# Altium footprint library RelaysTHD.PcbLib: 13 footprints
Each footprint in its own frame and in the unit in brackets; x right, y up, seen from the top. Pads: shape width x height; smd on the part's side, far side on the other; paste and mask are expansions set on the pad; w line width, h text height; cw(c..) or ccw(c..) is an arc to the next point about the centre after c.
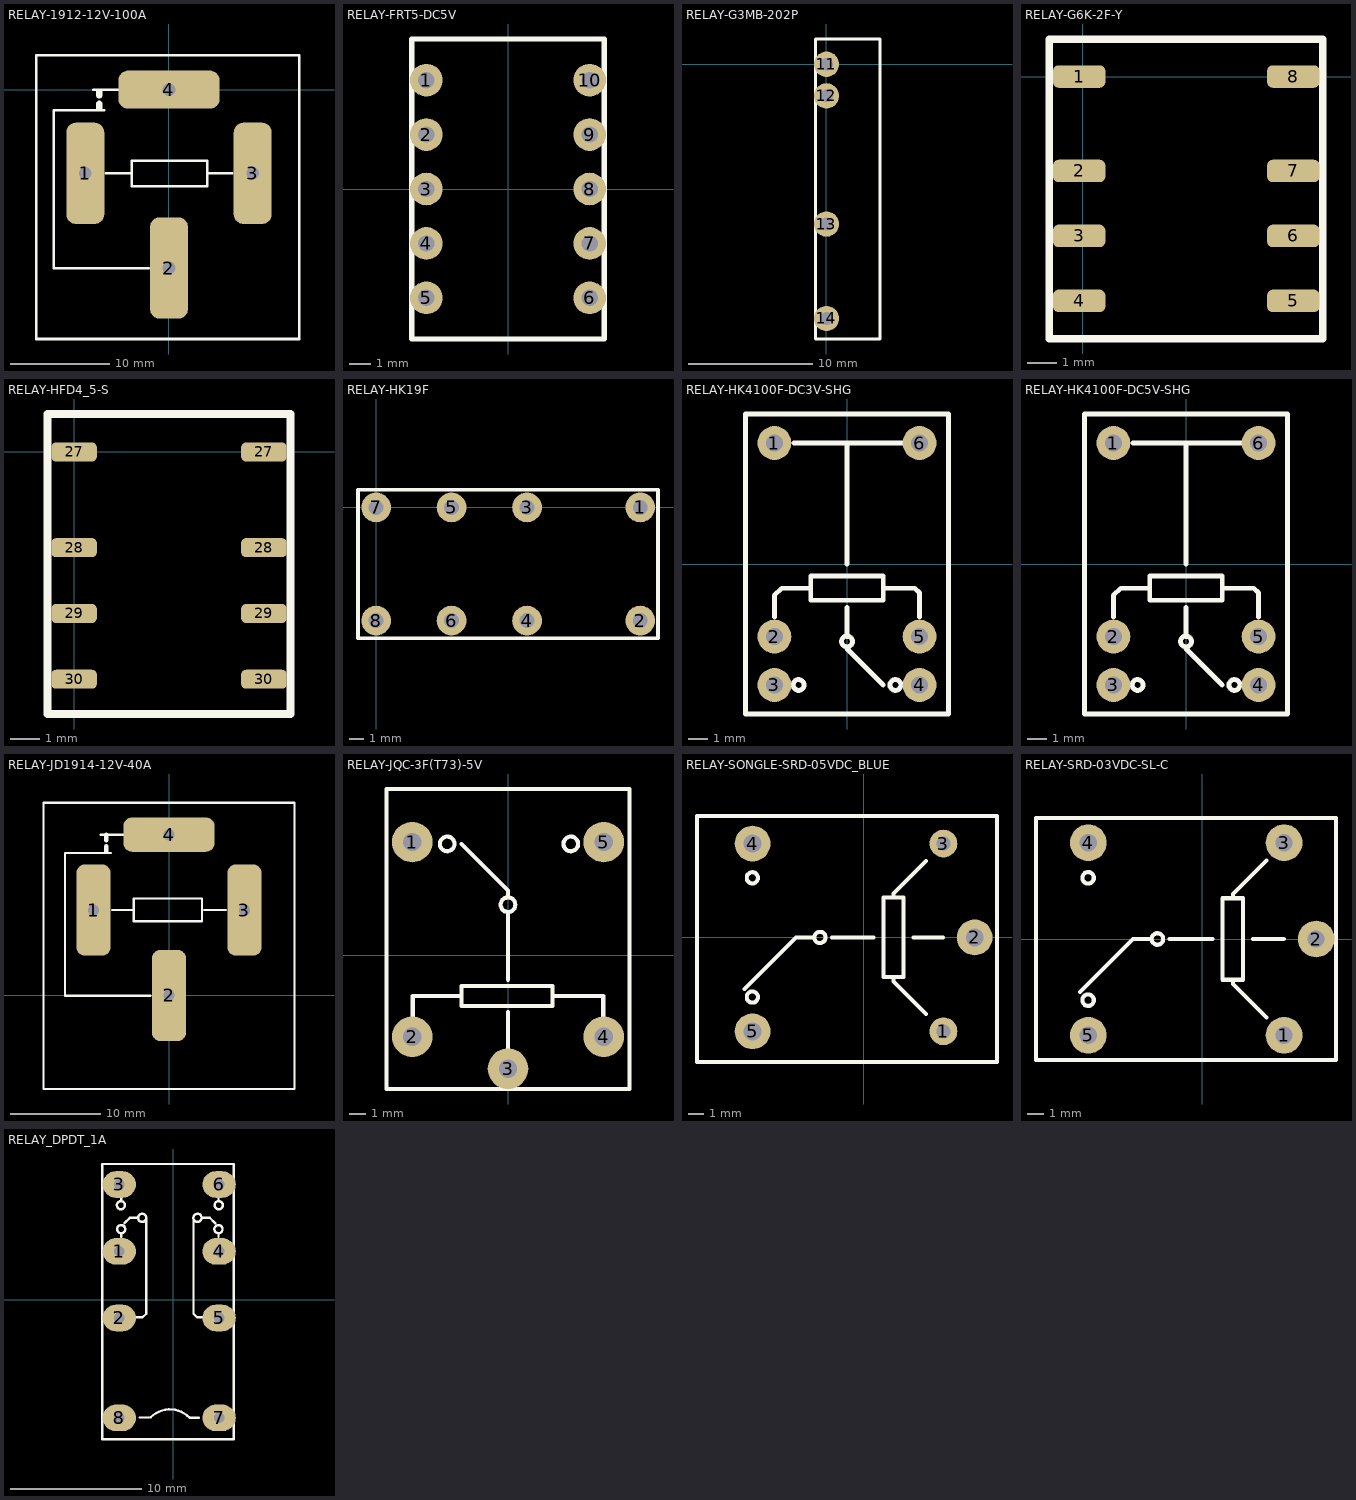
[diagram p0: the footprints below, top view; thin cyan lines are the x and y axes]

## RELAY-1912-12V-100A [mm]
pads (4):
  rrect50% 3.81x10.16 hole 1.27 square: 1(-8.4,-8.4) 2(0,-17.9) 3(8.4,-8.4)
  rrect50% 10.16x3.81 hole 1.27 square: 4(0,0)
Top Overlay:
  lines w0.254: -7.62,0 -5.08,0 ; -6.495,-2.05 -11.575,-2.05 -11.575,-17.925 -2.05,-17.925 ; -6.35,-8.4 -3.895,-8.4 ; 3.895,-8.4 6.35,-8.4 ; -13.335,-25.019 13.081,-25.019 13.081,3.429 -13.335,3.429 -13.335,-25.019 ; -3.759,-9.677 3.861,-9.677 3.861,-7.137 -3.759,-7.137 -3.759,-9.677
  lines w0.635: -6.985,-1.854 -6.985,-1.422 ; -6.985,-0.584 -6.985,-0.203
3D body "Relay - 1912-12V-100A.stp": height 22.95, standoff -11.81, extent -13.278,-25.016 13.078,3.41

## RELAY-FRT5-DC5V [mil]
pads (10):
  round 60 hole 30: 1(-150,200) 2(-150,100) 3(-150,0) 4(-150,-100) 5(-150,-200) 6(150,-200) 7(150,-100) 8(150,0) 9(150,100) 10(150,200)
Top Overlay:
  lines w10: -177.17,-275.59 177.17,-275.59 177.17,275.59 -177.17,275.59 -177.17,-275.59
3D body "Relay - FRT5-DC5V.stp": height 191, standoff -132, extent -178.5,-276.49 178.5,276.51

## RELAY-G3MB-202P [mil]
pads (4):
  round 80 hole 40: 11(0,0) 12(0,-100) 13(0,-506) 14(0,-805)
Top Overlay:
  lines w10: -35,-870 -35,80 170,80 170,-870 -35,-870
3D body "Relay - G3MB-202P.stp": height 794, standoff -153, extent -32,-868.5 168,78.5

## RELAY-G6K-2F-Y [mil]
pads (8):
  rrect50% 70x30 smd: 1(-5,0) 2(-5,-125.98) 3(-5,-212.6) 4(-5,-299.21) 5(280.59,-299.21) 6(280.59,-212.6) 7(280.59,-125.98) 8(280.59,0)
Top Overlay:
  lines w10: -45,-350 320,-350 320,50 -45,50 -45,-350
3D body "G6K-2F-Y.stp": height 214.6, standoff 0, extent -15.75,-346.41 291.33,47.29

## RELAY-HFD4_5-S [mil]
pads (8):
  rrect50% 60x25 smd: 27(0,0) 27(250,0) 28(0,-125.98) 28(250,-125.98) 29(0,-212.6) 29(250,-212.6) 30(0,-299.21) 30(250,-299.21)
Top Overlay:
  lines w10: -35,-345 285,-345 285,50 -35,50 -35,-345
3D body "HFD4_5-S.stp": height 232.1, standoff 0, extent -22.63,-345.64 272.64,48.06

## RELAY-HK19F [mm]
pads (8):
  round 2 hole 1: 1(17.78,0) 2(17.78,-7.62) 3(10.16,0) 4(10.16,-7.62) 5(5.08,0) 6(5.08,-7.62) 7(0,0) 8(0,-7.62)
Top Overlay:
  lines w0.254: -1.219,-8.814 18.974,-8.814 18.974,1.194 -1.219,1.194 -1.219,-8.814
3D body "HK19F.STEP": height 12, standoff -4, extent -1.22,-8.81 18.98,1.19

## RELAY-HK4100F-DC3V-SHG [mil]
pads (6):
  round 70 hole 35: 1(-150,250) 2(-150,-150) 3(-150,-250) 4(150,-250) 5(150,-150) 6(150,250)
Top Overlay:
  circle w10: c100,-250 r11.18
  circle w10: c-100,-250 r11.18
  circle w10: c0,-160 r11.18
  lines w10: -150,-110 -150,-65 -135,-50 -75,-50 ; -110,250 115,250 ; 0,-175 75,-250 ; 0,-150 0,-90 ; 0,0 0,250 ; 75,-50 140,-50 150,-60 150,-110 ; -210,-310 210,-310 210,310 -210,310 -210,-310 ; -75,-75 75,-75 75,-25 -75,-25 -75,-75
3D body "Relay -HK4100F-DC3V-SHG.stp": height 453, standoff -151, extent -204,-302.49 204,302.51

## RELAY-HK4100F-DC5V-SHG [mil]
pads (6):
  round 70 hole 35: 1(-150,250) 2(-150,-150) 3(-150,-250) 4(150,-250) 5(150,-150) 6(150,250)
Top Overlay:
  circle w10: c100,-250 r11.18
  circle w10: c-100,-250 r11.18
  circle w10: c0,-160 r11.18
  lines w10: -150,-110 -150,-65 -135,-50 -75,-50 ; -110,250 115,250 ; 0,-175 75,-250 ; 0,-150 0,-90 ; 0,0 0,250 ; 75,-50 140,-50 150,-60 150,-110 ; -210,-310 210,-310 210,310 -210,310 -210,-310 ; -75,-75 75,-75 75,-25 -75,-25 -75,-75
3D body "Relay -HK4100F-DC5V-SHG.stp": height 453, standoff -151, extent -204,-302.49 204,302.51

## RELAY-JD1914-12V-40A [mm]
pads (4):
  rrect50% 3.81x10.16 hole 1.27 square: 1(-8.4,9.5) 2(0,0) 3(8.4,9.5)
  rrect50% 10.16x3.81 hole 1.27 square: 4(0,17.9)
Top Overlay:
  lines w0.254: -7.62,17.9 -5.08,17.9 ; -6.495,15.85 -11.575,15.85 -11.575,-0.025 -2.05,-0.025 ; -6.35,9.5 -3.895,9.5 ; 3.895,9.5 6.35,9.5 ; -13.97,-10.414 13.97,-10.414 13.97,21.463 -13.97,21.463 -13.97,-10.414 ; -3.937,8.255 3.683,8.255 3.683,10.795 -3.937,10.795 -3.937,8.255
  lines w0.508: -6.985,15.995 -6.985,16.63 ; -6.985,17.265 -6.985,17.9
3D body "Relay -JD1914-12V-40A.stp": height 41.05, standoff -11.81, extent -13.83,-10.312 13.83,21.438

## RELAY-JQC-3F(T73)-5V [mm]
pads (5):
  round 2.54 hole 1.143: 1(-6,7.1) 2(-6,-5.1) 3(0,-7.1) 4(6,-5.1) 5(6,7.1)
Top Overlay:
  circle w0.254: c-3.81,6.985 r0.458
  circle w0.254: c0,3.175 r0.458
  circle w0.254: c3.937,6.985 r0.458
  lines w0.254: -5.969,-3.81 -5.969,-2.54 -2.921,-2.54 ; -2.921,6.985 0,4.064 0,3.81 ; 0,-5.842 0,-3.556 ; 0,-1.524 0,2.667 ; 2.794,-2.54 5.969,-2.54 5.969,-3.81 ; -7.62,-8.37 7.62,-8.37 7.62,10.426 -7.62,10.426 -7.62,-8.37 ; -2.921,-3.175 2.794,-3.175 2.794,-1.905 -2.921,-1.905 -2.921,-3.175
3D body "Relay - JQC-3F(T73) - 5V.stp": height 14.94, standoff -3.61, extent -7.544,-8.319 7.544,10.375

## RELAY-SONGLE-SRD-05VDC_BLUE [mil]
pads (5):
  round 70 hole 35: 1(200.61,-236.22) 3(200.61,236.22)
  round 90 hole 45: 2(279.35,0) 4(-279.7,236.22) 5(-279.7,-236.22)
Top Overlay:
  circle w10: c-110.17,0 r14.14
  circle w10: c-280.17,-150 r14.14
  circle w10: c-280.17,150 r14.14
  lines w10: -300.17,-130 -170.17,0 -124.31,0 ; -80.17,0 24.83,0 ; 74.83,-100 74.83,-110.43 157.11,-192.72 ; 74.83,100 74.83,110.43 157.11,192.72 ; 124.83,0 199.83,0 ; -419.46,-313.94 -419.46,306.1 335.46,306.1 335.46,-313.94 -419.46,-313.94 ; 49.83,-100 49.83,100 99.83,100 99.83,-100 49.83,-100
3D body "RELAY_SRD-05VDC.STEP": height 625.98, standoff -110.24, extent -418.12,-309.08 337.79,305.09

## RELAY-SRD-03VDC-SL-C [mil]
pads (5):
  round 90 hole 42: 1(200.61,-236.22) 2(279.35,0) 3(200.61,236.22) 4(-279.7,236.22) 5(-279.7,-236.22)
Top Overlay:
  circle w10: c-110.17,0 r14.14
  circle w10: c-280.17,-150 r14.14
  circle w10: c-280.17,150 r14.14
  lines w10: -300.17,-130 -170.17,0 -124.31,0 ; -80.17,0 24.83,0 ; 74.83,-100 74.83,-110.43 157.11,-192.72 ; 74.83,100 74.83,110.43 157.11,192.72 ; 124.83,0 199.83,0 ; -408,-297 -408,297 328,297 328,-297 -408,-297 ; 49.83,-100 49.83,100 99.83,100 99.83,-100 49.83,-100
3D body "Relay - SRD-03VDC-SL-C.stp": height 588.1, standoff -142.3, extent -408,-297 328,297

## RELAY_DPDT_1A [mil]
pads (8):
  oval 100x80 hole 32: 1(-162.83,145.87) 2(-162.83,-54.13) 3(-162.83,346.87) 4(137.17,145.87) 5(137.17,-54.13) 6(137.17,346.87) 7(137.17,-354.13) 8(-162.83,-354.13)
Top Overlay:
  circle w7: c-157.83,284.63 r12.24
  circle w7: c-156.83,212.63 r12.24
  circle w7: c-93.83,246.63 r12.24
  circle w7: c72.17,246.63 r12.24
  circle w7: c135.17,212.63 r12.24
  circle w7: c136.17,284.63 r12.24
  lines w7: -156.83,189.87 -156.83,197.87 ; -156.83,298.87 -156.83,303.87 ; -146.83,230.87 -130.83,246.87 -107.83,246.87 ; -120.83,-52.13 -92.83,-52.13 -81.83,-41.13 -81.83,244.87 ; -101.83,-353.13 -68.83,-353.13 ; -67.83,-352.13 cw(c-10.33,-410.63) 48.17,-353.13 ; 49.17,-354.13 76.17,-354.13 ; 60.17,244.87 60.17,-41.13 71.17,-52.13 92.17,-52.13 ; 86.17,246.87 109.17,246.87 125.17,230.87 ; 135.17,189.87 135.17,197.87 ; 135.17,298.87 135.17,303.87 ; -213.83,-418.39 -213.83,408.39 181.02,408.39 181.02,-418.39 -213.83,-418.39
3D body "SW3dPS-DSY2Y.STEP": height 484.25, standoff -118.11, extent -208.66,-413.58 177.17,405.31